# Altium footprint library Reflow3D1411sep.PcbLib: 657 footprints (part 2 of 42)
Each footprint in its own frame and in the unit in brackets; x right, y up, seen from the top. Pads: shape width x height; smd on the part's side, far side on the other; paste and mask are expansions set on the pad; w line width, h text height; cw(c..) or ccw(c..) is an arc to the next point about the centre after c.
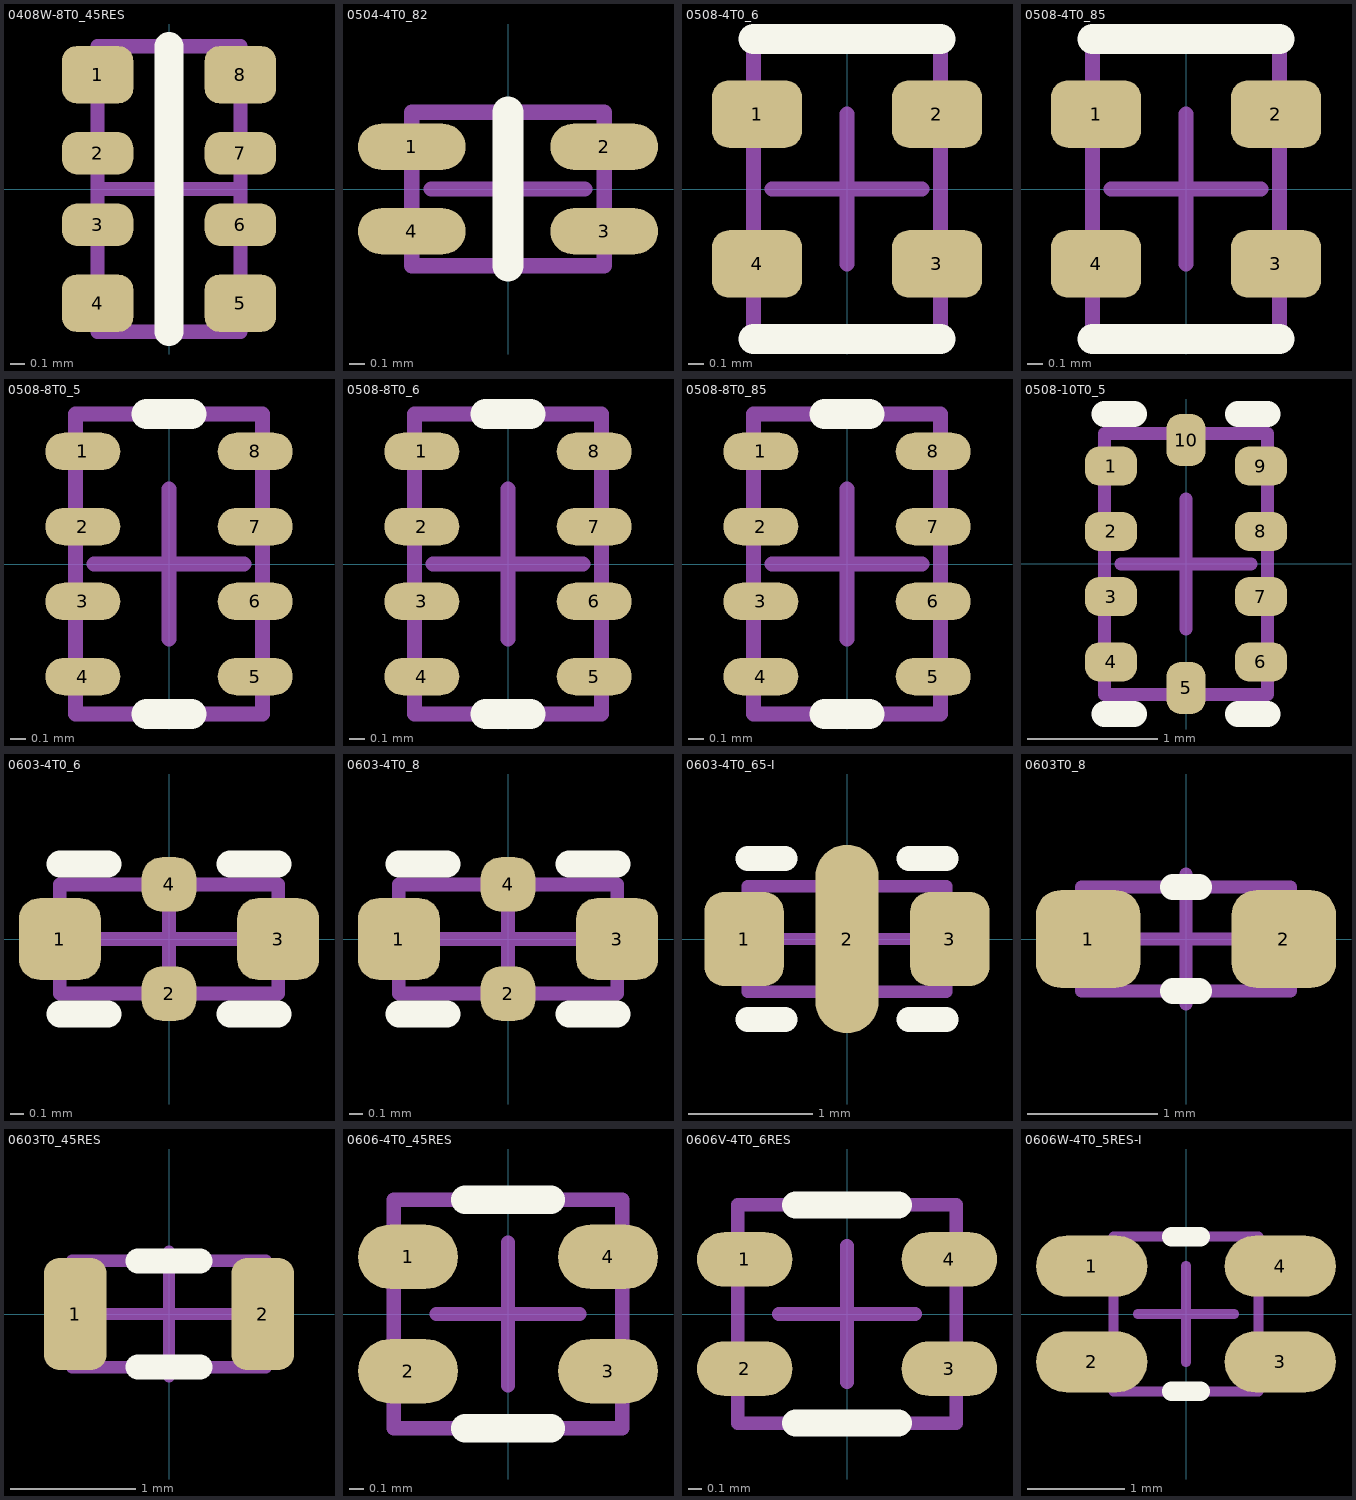
[diagram p1: the footprints below, top view; thin cyan lines are the x and y axes]

## 0408W-8T0_45RES [mm] "www.vishay.com, cra04s.pdf; www.bourns.com, CAY10.pdf"
height 0.45
pads (8):
  rrect50% 0.5x0.4 smd mask+0.05: 1(-0.5,0.8) 4(-0.5,-0.8) 5(0.5,-0.8) 8(0.5,0.8)
  rrect75% 0.5x0.3 smd mask+0.05: 2(-0.5,0.25) 3(-0.5,-0.25) 6(0.5,-0.25) 7(0.5,0.25)
Top Overlay:
  lines w0.2: 0,-1 0,1
Mechanical 13:
  lines w0.1: -0.5,-1 -0.5,1 0.5,1 0.5,-1 -0.5,-1
Mechanical 15:
  lines w0.1: -0.5,0 0.5,0 ; 0,-0.5 0,0.5
3D body: height 0.55, standoff 0, extent -0.575,-1.1 0.575,1.1

## 0504-4T0_82 [mm] "www.murata.com, c31e.pdf, DLP11S"
height 0.82
pads (4):
  oval 0.7x0.3 smd paste-25.4 mask+0.05: 1(-0.625,0.275) 2(0.625,0.275) 3(0.625,-0.275) 4(-0.625,-0.275)
Top Overlay:
  lines w0.2: 0,-0.5 0,0.5
Top Paste:
  region: -0.275,0.425 -0.775,0.425 -0.775,0.125 -0.275,0.125
  region: -0.275,-0.125 -0.775,-0.125 -0.775,-0.425 -0.275,-0.425
  region: 0.775,-0.125 0.275,-0.125 0.275,-0.425 0.775,-0.425
  region: 0.775,0.425 0.275,0.425 0.275,0.125 0.775,0.125
Mechanical 13:
  lines w0.1: -0.625,-0.5 0.625,-0.5 0.625,0.5 -0.625,0.5 -0.625,-0.5
Mechanical 15:
  lines w0.1: -0.5,0 0.5,0 ; 0,-0.5 0,0.5
3D body: height 0.92, standoff 0, extent -0.675,-0.55 0.675,0.55

## 0508-4T0_6 [mm] "www.murata.com, c02e.pdf, GNM212"
height 0.6
pads (4):
  rrect50% 0.6x0.45 smd mask+0.075: 1(-0.6,0.5) 2(0.6,0.5) 3(0.6,-0.5) 4(-0.6,-0.5)
Top Overlay:
  lines w0.2: -0.625,-1 0.625,-1 ; -0.625,1 0.625,1
Mechanical 13:
  lines w0.1: -0.625,-1 0.625,-1 0.625,1 -0.625,1 -0.625,-1
Mechanical 15:
  lines w0.1: -0.5,0 0.5,0 ; 0,-0.5 0,0.5
3D body: height 0.7, standoff 0, extent -0.7,-1.075 0.7,1.075

## 0508-4T0_85 [mm] "www.murata.com, c02e.pdf, GNM212"
height 0.85
pads (4):
  rrect50% 0.6x0.45 smd mask+0.075: 1(-0.6,0.5) 2(0.6,0.5) 3(0.6,-0.5) 4(-0.6,-0.5)
Top Overlay:
  lines w0.2: -0.625,-1 0.625,-1 ; -0.625,1 0.625,1
Mechanical 13:
  lines w0.1: -0.625,-1 0.625,-1 0.625,1 -0.625,1 -0.625,-1
Mechanical 15:
  lines w0.1: -0.5,0 0.5,0 ; 0,-0.5 0,0.5
3D body: height 0.95, standoff 0, extent -0.7,-1.075 0.7,1.075

## 0508-8T0_5 [mm] "www.murata.com, c02e.pdf, GNM214"
height 0.5
pads (8):
  oval 0.5x0.25 smd mask+0.05: 1(-0.575,0.75) 2(-0.575,0.25) 3(-0.575,-0.25) 4(-0.575,-0.75) 5(0.575,-0.75) 6(0.575,-0.25) 7(0.575,0.25) 8(0.575,0.75)
Top Overlay:
  lines w0.2: -0.15,-1 0.15,-1 ; -0.15,1 0.15,1
Mechanical 13:
  lines w0.1: -0.625,-1 -0.625,1 0.625,1 0.625,-1 -0.625,-1
Mechanical 15:
  lines w0.1: -0.5,0 0.5,0 ; 0,-0.5 0,0.5
3D body: height 0.55, standoff 0, extent -0.7,-1.075 0.7,1.075

## 0508-8T0_6 [mm] "www.murata.com, c02e.pdf, GNM214"
height 0.6
pads (8):
  oval 0.5x0.25 smd mask+0.05: 1(-0.575,0.75) 2(-0.575,0.25) 3(-0.575,-0.25) 4(-0.575,-0.75) 5(0.575,-0.75) 6(0.575,-0.25) 7(0.575,0.25) 8(0.575,0.75)
Top Overlay:
  lines w0.2: -0.15,-1 0.15,-1 ; -0.15,1 0.15,1
Mechanical 13:
  lines w0.1: -0.625,-1 -0.625,1 0.625,1 0.625,-1 -0.625,-1
Mechanical 15:
  lines w0.1: -0.5,0 0.5,0 ; 0,-0.5 0,0.5
3D body: height 0.7, standoff 0, extent -0.7,-1.075 0.7,1.075

## 0508-8T0_85 [mm] "www.murata.com, c02e.pdf, GNM214"
height 0.85
pads (8):
  oval 0.5x0.25 smd mask+0.05: 1(-0.575,0.75) 2(-0.575,0.25) 3(-0.575,-0.25) 4(-0.575,-0.75) 5(0.575,-0.75) 6(0.575,-0.25) 7(0.575,0.25) 8(0.575,0.75)
Top Overlay:
  lines w0.2: -0.15,-1 0.15,-1 ; -0.15,1 0.15,1
Mechanical 13:
  lines w0.1: -0.625,-1 -0.625,1 0.625,1 0.625,-1 -0.625,-1
Mechanical 15:
  lines w0.1: -0.5,0 0.5,0 ; 0,-0.5 0,0.5
3D body: height 0.95, standoff 0, extent -0.7,-1.075 0.7,1.075

## 0508-10T0_5 [mm] "www.murata.com, c02e.pdf, LLM215"
height 0.5
pads (10):
  rrect75% 0.4x0.3 smd mask+0.05: 1(-0.575,0.75) 2(-0.575,0.25) 3(-0.575,-0.25) 4(-0.575,-0.75) 6(0.575,-0.75) 7(0.575,-0.25) 8(0.575,0.25) 9(0.575,0.75)
  rrect75% 0.3x0.4 smd mask+0.05: 5(0,-0.95) 10(0,0.95)
Top Overlay:
  lines w0.2: -0.625,-1.15 -0.4,-1.15 ; -0.625,1.15 -0.4,1.15 ; 0.4,-1.15 0.625,-1.15 ; 0.4,1.15 0.625,1.15
Mechanical 13:
  lines w0.1: -0.625,-1 0.625,-1 0.625,1 -0.625,1 -0.625,-1
Mechanical 15:
  lines w0.1: -0.5,0 0.5,0 ; 0,-0.5 0,0.5
3D body: height 0.55, standoff 0, extent -0.675,-1.05 0.675,1.05

## 0603-4T0_6 [mm] "www.murata.com, c31e.pdf, NFM18PC"
height 0.6
pads (4):
  rrect50% 0.6x0.6 smd mask+0.075: 1(-0.8,0) 3(0.8,0)
  rrect75% 0.4x0.4 smd mask+0.075: 2(0,-0.4) 4(0,0.4)
Top Overlay:
  lines w0.2: -0.8,-0.55 -0.45,-0.55 ; -0.8,0.55 -0.45,0.55 ; 0.45,-0.55 0.8,-0.55 ; 0.45,0.55 0.8,0.55
Mechanical 13:
  lines w0.1: -0.8,-0.4 0.8,-0.4 0.8,0.4 -0.8,0.4 -0.8,-0.4
Mechanical 15:
  lines w0.1: -0.5,0 0.5,0 ; 0,-0.5 0,0.5
3D body: height 0.7, standoff 0, extent -0.85,-0.45 0.85,0.45

## 0603-4T0_8 [mm] "www.murata.com, c31e.pdf, NFL18ST"
height 0.8
pads (4):
  rrect50% 0.6x0.6 smd mask+0.075: 1(-0.8,0) 3(0.8,0)
  rrect75% 0.4x0.4 smd mask+0.075: 2(0,-0.4) 4(0,0.4)
Top Overlay:
  lines w0.2: -0.8,-0.55 -0.45,-0.55 ; -0.8,0.55 -0.45,0.55 ; 0.45,-0.55 0.8,-0.55 ; 0.45,0.55 0.8,0.55
Mechanical 13:
  lines w0.1: -0.8,-0.4 -0.8,0.4 0.8,0.4 0.8,-0.4 -0.8,-0.4
Mechanical 15:
  lines w0.1: -0.5,0 0.5,0 ; 0,-0.5 0,0.5
3D body: height 0.9, standoff 0, extent -0.85,-0.45 0.85,0.45

## 0603-4T0_65-I [mm] "www.yageo.com, X2Y_series_13.pdf"
height 0.65
pads (3):
  rrect50% 0.64x0.76 smd mask+0.05: 1(-0.83,0) 3(0.83,0)
  oval 0.51x1.52 smd mask+0.05: 2(0,0)
Top Overlay:
  lines w0.2: -0.8,-0.65 -0.5,-0.65 ; -0.8,0.65 -0.5,0.65 ; 0.5,-0.65 0.8,-0.65 ; 0.5,0.65 0.8,0.65
Mechanical 13:
  lines w0.1: -0.8,-0.425 0.8,-0.425 0.8,0.425 -0.8,0.425 -0.8,-0.425
Mechanical 15:
  lines w0.1: -0.5,0 0.5,0 ; 0,-0.5 0,0.5
3D body: height 0.75, standoff 0, extent -0.875,-0.5 0.875,0.5

## 0603T0_8 [mm] "www.avx.com, smccp.pdf; www.kemet.com, F3102_C0G.pdf"
height 0.8
pads (2):
  rrect50% 0.8x0.75 smd mask+0.075: 1(-0.75,0) 2(0.75,0)
Top Overlay:
  lines w0.2: -0.1,-0.4 0.1,-0.4 ; -0.1,0.4 0.1,0.4
Mechanical 13:
  lines w0.1: -0.8,-0.4 0.8,-0.4 0.8,0.4 -0.8,0.4 -0.8,-0.4
Mechanical 15:
  lines w0.1: -0.5,0 0.5,0 ; 0,-0.5 0,0.5
3D body: height 0.95, standoff 0, extent -0.875,-0.475 0.875,0.475

## 0603T0_45RES [mm] "www.vishay.com, dcrcwe3.pdf"
height 0.45
pads (2):
  rrect50% 0.5x0.9 smd mask+0.075: 1(-0.75,0) 2(0.75,0)
Top Overlay:
  lines w0.2: -0.25,-0.425 0.25,-0.425 ; -0.25,0.425 0.25,0.425
Mechanical 13:
  lines w0.1: -0.775,-0.425 -0.775,0.425 0.775,0.425 0.775,-0.425 -0.775,-0.425
Mechanical 15:
  lines w0.1: -0.5,0 0.5,0 ; 0,-0.5 0,0.5
3D body: height 0.5, standoff 0, extent -0.825,-0.475 0.825,0.475

## 0606-4T0_45RES [mm] "www.bourns.com, CATCAY.pdf, CAY16-J2"
height 0.45
pads (4):
  oval 0.7x0.45 smd mask+0.075: 1(-0.7,0.4) 2(-0.7,-0.4) 3(0.7,-0.4) 4(0.7,0.4)
Top Overlay:
  lines w0.2: -0.3,-0.8 0.3,-0.8 ; -0.3,0.8 0.3,0.8
Mechanical 13:
  lines w0.1: -0.8,-0.8 0.8,-0.8 0.8,0.8 -0.8,0.8 -0.8,-0.8
Mechanical 15:
  lines w0.1: -0.5,0 0.5,0 ; 0,-0.5 0,0.5
3D body: height 0.6, standoff 0, extent -0.875,-0.875 0.875,0.875

## 0606V-4T0_6RES [mm] "www.bourns.com, CATCAY.pdf, CAT16-J2"
height 0.6
pads (4):
  oval 0.7x0.4 smd mask+0.075: 1(-0.75,0.4) 2(-0.75,-0.4) 3(0.75,-0.4) 4(0.75,0.4)
Top Overlay:
  lines w0.2: -0.375,-0.8 0.375,-0.8 ; -0.375,0.8 0.375,0.8
Mechanical 13:
  lines w0.1: -0.8,-0.8 -0.8,0.8 0.8,0.8 0.8,-0.8 -0.8,-0.8
Mechanical 15:
  lines w0.1: -0.5,0 0.5,0 ; 0,-0.5 0,0.5
3D body: height 0.75, standoff 0, extent -0.875,-0.875 0.875,0.875

## 0606W-4T0_5RES-I [mm] "www.vishay.com, cra06es.pdf, S-Version"
height 0.5
pads (4):
  oval 1.15x0.63 smd mask+0.075: 1(-0.975,0.495) 2(-0.975,-0.495) 3(0.975,-0.495) 4(0.975,0.495)
Top Overlay:
  lines w0.2: -0.15,-0.8 0.15,-0.8 ; -0.15,0.8 0.15,0.8
Mechanical 13:
  lines w0.1: -0.75,-0.8 0.75,-0.8 0.75,0.8 -0.75,0.8 -0.75,-0.8
Mechanical 15:
  lines w0.1: -0.5,0 0.5,0 ; 0,-0.5 0,0.5
3D body: height 0.6, standoff 0, extent -0.825,-0.875 0.825,0.875